# Altium footprint library LION.PcbLib: 90 footprints (part 10 of 13)
Each footprint in its own frame and in the unit in brackets; x right, y up, seen from the top. Pads: shape width x height; smd on the part's side, far side on the other; paste and mask are expansions set on the pad; w line width, h text height; cw(c..) or ccw(c..) is an arc to the next point about the centre after c.
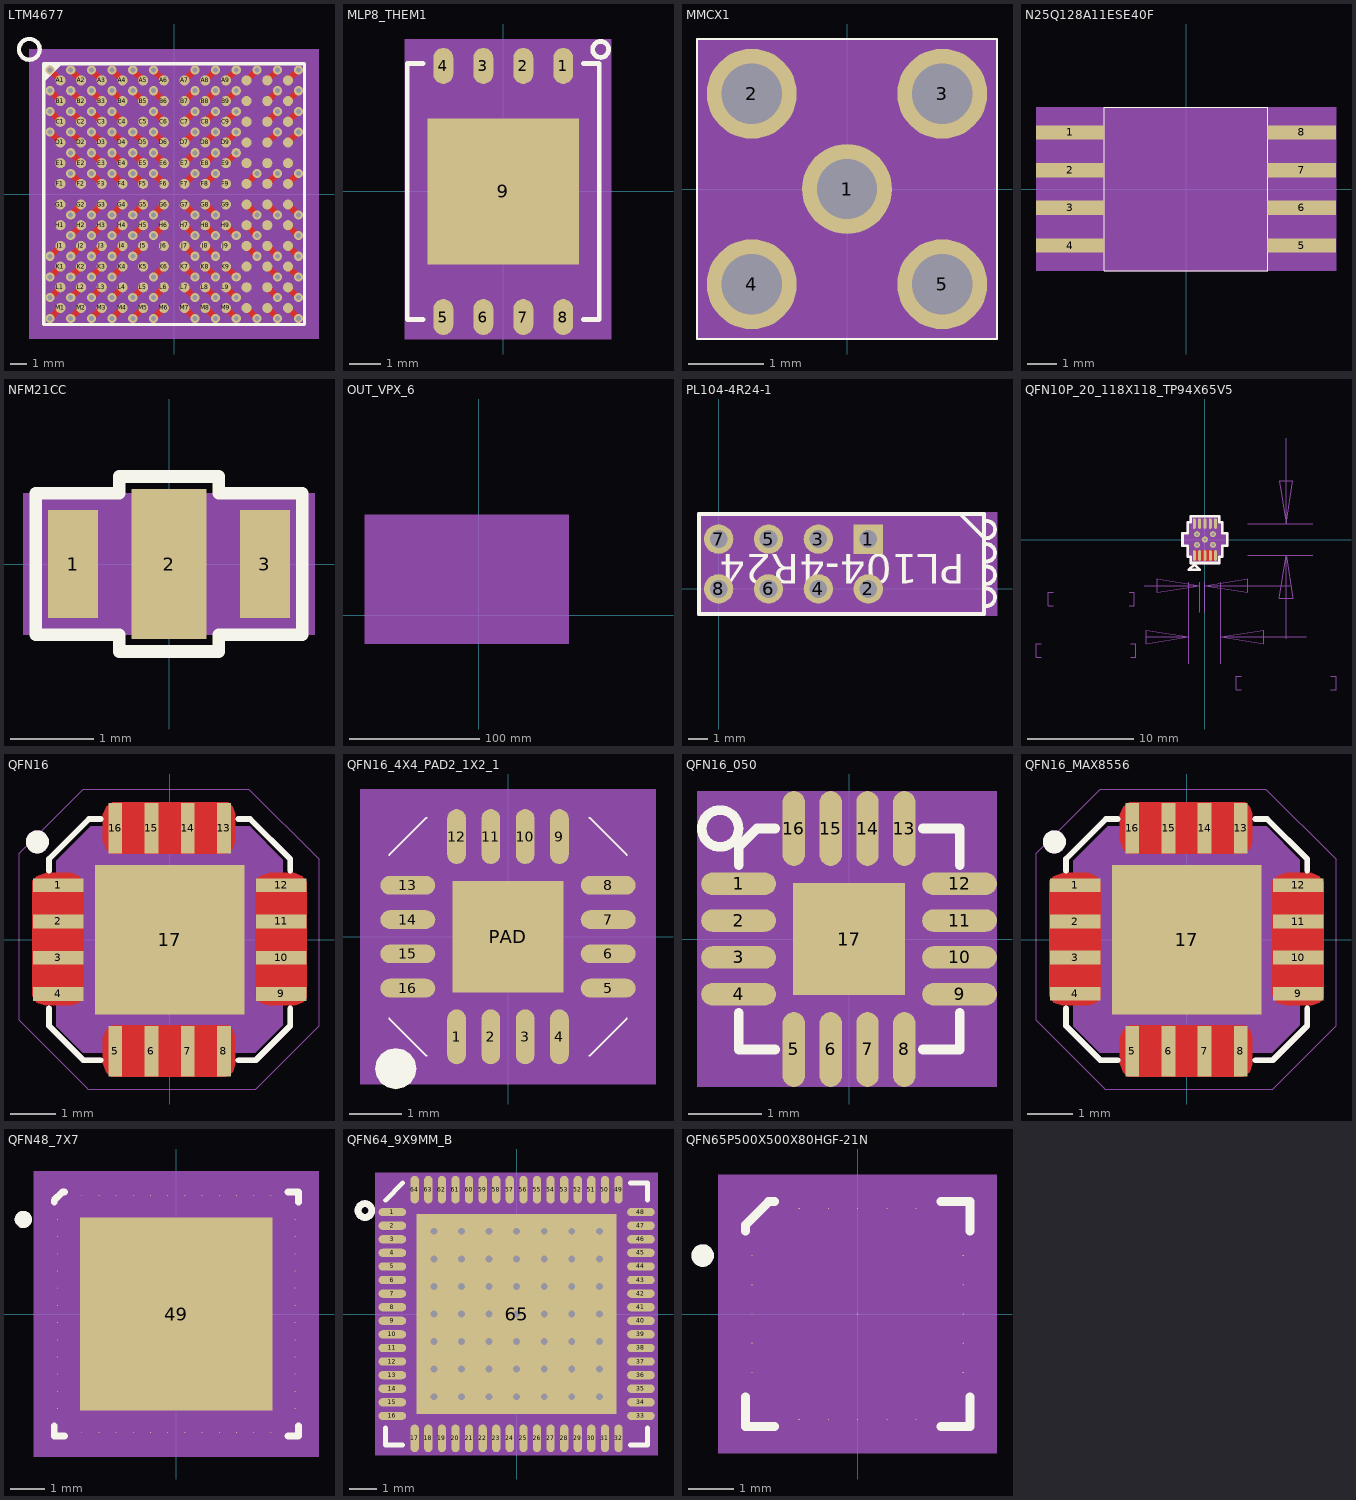
[diagram p9: the footprints below, top view; thin cyan lines are the x and y axes]

## LTM4677 [mm] "LTM4677"
pads (144):
  round 0.62 smd: A1(-6.985,6.985) A2(-5.715,6.985) A3(-4.445,6.985) A4(-3.175,6.985) A5(-1.905,6.985) A6(-0.635,6.985) A7(0.635,6.985) A8(1.905,6.985) A9(3.175,6.985) A10(4.445,6.985) A11(5.715,6.985) A12(6.985,6.985) B1(-6.985,5.715) B2(-5.715,5.715) B3(-4.445,5.715) B4(-3.175,5.715) B5(-1.905,5.715) B6(-0.635,5.715) B7(0.635,5.715) B8(1.905,5.715) B9(3.175,5.715) B10(4.445,5.715) B11(5.715,5.715) B12(6.985,5.715) C1(-6.985,4.445) C2(-5.715,4.445) C3(-4.445,4.445) C4(-3.175,4.445) C5(-1.905,4.445) C6(-0.635,4.445) C7(0.635,4.445) C8(1.905,4.445) C9(3.175,4.445) C10(4.445,4.445) C11(5.715,4.445) C12(6.985,4.445) D1(-6.985,3.175) D2(-5.715,3.175) D3(-4.445,3.175) D4(-3.175,3.175) D5(-1.905,3.175) D6(-0.635,3.175) D7(0.635,3.175) D8(1.905,3.175) D9(3.175,3.175) D10(4.445,3.175) D11(5.715,3.175) D12(6.985,3.175) E1(-6.985,1.905) E2(-5.715,1.905) E3(-4.445,1.905) E4(-3.175,1.905) E5(-1.905,1.905) E6(-0.635,1.905) E7(0.635,1.905) E8(1.905,1.905) E9(3.175,1.905) E10(4.445,1.905) E11(5.715,1.905) E12(6.985,1.905) F1(-6.985,0.635) F2(-5.715,0.635) F3(-4.445,0.635) F4(-3.175,0.635) F5(-1.905,0.635) F6(-0.635,0.635) F7(0.635,0.635) F8(1.905,0.635) F9(3.175,0.635) F10(4.445,0.635) F11(5.715,0.635) F12(6.985,0.635) G1(-6.985,-0.635) G2(-5.715,-0.635) G3(-4.445,-0.635) G4(-3.175,-0.635) G5(-1.905,-0.635) G6(-0.635,-0.635) G7(0.635,-0.635) G8(1.905,-0.635) G9(3.175,-0.635) G10(4.445,-0.635) G11(5.715,-0.635) G12(6.985,-0.635) H1(-6.985,-1.905) H2(-5.715,-1.905) H3(-4.445,-1.905) H4(-3.175,-1.905) H5(-1.905,-1.905) H6(-0.635,-1.905) H7(0.635,-1.905) H8(1.905,-1.905) H9(3.175,-1.905) H10(4.445,-1.905) H11(5.715,-1.905) H12(6.985,-1.905) J1(-6.985,-3.175) J2(-5.715,-3.175) J3(-4.445,-3.175) J4(-3.175,-3.175) J5(-1.905,-3.175) J6(-0.635,-3.175) J7(0.635,-3.175) J8(1.905,-3.175) J9(3.175,-3.175) J10(4.445,-3.175) J11(5.715,-3.175) J12(6.985,-3.175) K1(-6.985,-4.445) K2(-5.715,-4.445) K3(-4.445,-4.445) K4(-3.175,-4.445) K5(-1.905,-4.445) K6(-0.635,-4.445) K7(0.635,-4.445) K8(1.905,-4.445) K9(3.175,-4.445) K10(4.445,-4.445) K11(5.715,-4.445) K12(6.985,-4.445) L1(-6.985,-5.715) L2(-5.715,-5.715) L3(-4.445,-5.715) L4(-3.175,-5.715) L5(-1.905,-5.715) L6(-0.635,-5.715) L7(0.635,-5.715) L8(1.905,-5.715) L9(3.175,-5.715) L10(4.445,-5.715) L11(5.715,-5.715) L12(6.985,-5.715) M1(-6.985,-6.985) M2(-5.715,-6.985) M3(-4.445,-6.985) M4(-3.175,-6.985) M5(-1.905,-6.985) M6(-0.635,-6.985) M7(0.635,-6.985) M8(1.905,-6.985) M9(3.175,-6.985) M10(4.445,-6.985) M11(5.715,-6.985) M12(6.985,-6.985)
via -3.81,2.54 diameter 0.559 hole 0.305
via -1.27,1.27 diameter 0.559 hole 0.305
via -7.62,-3.81 diameter 0.559 hole 0.305
via -6.35,-3.81 diameter 0.559 hole 0.305
via -5.08,-3.81 diameter 0.559 hole 0.305
via -7.62,-5.08 diameter 0.559 hole 0.305
via -6.35,-5.08 diameter 0.559 hole 0.305
via -5.08,-5.08 diameter 0.559 hole 0.305
via -7.62,-6.35 diameter 0.559 hole 0.305
via -6.35,-6.35 diameter 0.559 hole 0.305
via -5.08,-6.35 diameter 0.559 hole 0.305
via -7.62,-7.62 diameter 0.559 hole 0.305
via -6.35,-7.62 diameter 0.559 hole 0.305
via -5.08,-7.62 diameter 0.559 hole 0.305
via -7.62,7.62 diameter 0.559 hole 0.305
via -6.35,7.62 diameter 0.559 hole 0.305
via -5.08,7.62 diameter 0.559 hole 0.305
via -5.08,3.81 diameter 0.559 hole 0.305
via -6.35,3.81 diameter 0.559 hole 0.305
via -7.62,3.81 diameter 0.559 hole 0.305
via -5.08,5.08 diameter 0.559 hole 0.305
via -6.35,5.08 diameter 0.559 hole 0.305
via -7.62,5.08 diameter 0.559 hole 0.305
via -5.08,6.35 diameter 0.559 hole 0.305
via -6.35,6.35 diameter 0.559 hole 0.305
via -7.62,6.35 diameter 0.559 hole 0.305
via 3.81,3.81 diameter 0.559 hole 0.305
via 3.81,-2.54 diameter 0.559 hole 0.305
via -3.81,1.27 diameter 0.559 hole 0.305
via -2.54,2.54 diameter 0.559 hole 0.305
via -2.54,1.27 diameter 0.559 hole 0.305
via -2.54,-7.62 diameter 0.559 hole 0.305
via -1.27,3.81 diameter 0.559 hole 0.305
via 2.54,3.81 diameter 0.559 hole 0.305
via -2.54,-3.81 diameter 0.559 hole 0.305
via 2.54,-3.81 diameter 0.559 hole 0.305
via -1.27,-1.27 diameter 0.559 hole 0.305
via -2.54,-1.27 diameter 0.559 hole 0.305
via -1.27,-5.08 diameter 0.559 hole 0.305
via -6.35,1.27 diameter 0.559 hole 0.305
via -2.54,3.81 diameter 0.559 hole 0.305
via -3.81,-2.54 diameter 0.559 hole 0.305
via 1.27,-3.81 diameter 0.559 hole 0.305
via -6.35,2.54 diameter 0.559 hole 0.305
via -6.35,-1.27 diameter 0.559 hole 0.305
via -1.27,-2.54 diameter 0.559 hole 0.305
via -2.54,-2.54 diameter 0.559 hole 0.305
via -6.35,-2.54 diameter 0.559 hole 0.305
via -3.81,-1.27 diameter 0.559 hole 0.305
via -2.54,7.62 diameter 0.559 hole 0.305
via -1.27,2.54 diameter 0.559 hole 0.305
via 2.54,2.54 diameter 0.559 hole 0.305
via 2.54,-2.54 diameter 0.559 hole 0.305
via 1.27,-2.54 diameter 0.559 hole 0.305
via 1.27,2.54 diameter 0.559 hole 0.305
via 7.62,-7.62 diameter 0.559 hole 0.305
via 6.35,-7.62 diameter 0.559 hole 0.305
via 7.62,-6.35 diameter 0.559 hole 0.305
via 6.35,-6.35 diameter 0.559 hole 0.305
via 7.62,-5.08 diameter 0.559 hole 0.305
via 6.35,-5.08 diameter 0.559 hole 0.305
via 7.62,-3.81 diameter 0.559 hole 0.305
via 6.35,-3.81 diameter 0.559 hole 0.305
via 7.62,-2.54 diameter 0.559 hole 0.305
via 6.35,1.27 diameter 0.559 hole 0.305
via 7.62,1.27 diameter 0.559 hole 0.305
via 6.35,6.35 diameter 0.559 hole 0.305
via 7.62,6.35 diameter 0.559 hole 0.305
via 6.35,5.08 diameter 0.559 hole 0.305
via 7.62,5.08 diameter 0.559 hole 0.305
via 6.35,3.81 diameter 0.559 hole 0.305
via 7.62,3.81 diameter 0.559 hole 0.305
via 7.62,7.62 diameter 0.559 hole 0.305
via 6.35,7.62 diameter 0.559 hole 0.305
via -1.27,-6.35 diameter 0.559 hole 0.305
via -1.27,-7.62 diameter 0.559 hole 0.305
via -3.81,-6.35 diameter 0.559 hole 0.305
via -2.54,-6.35 diameter 0.559 hole 0.305
via -3.81,-7.62 diameter 0.559 hole 0.305
via 1.27,-5.08 diameter 0.559 hole 0.305
via 2.54,-5.08 diameter 0.559 hole 0.305
via 3.81,-5.08 diameter 0.559 hole 0.305
via 1.27,-6.35 diameter 0.559 hole 0.305
via 2.54,-6.35 diameter 0.559 hole 0.305
via 3.81,-6.35 diameter 0.559 hole 0.305
via 1.27,-7.62 diameter 0.559 hole 0.305
via 2.54,-7.62 diameter 0.559 hole 0.305
via 3.81,-7.62 diameter 0.559 hole 0.305
via 5.08,-7.62 diameter 0.559 hole 0.305
via 5.08,-2.54 diameter 0.559 hole 0.305
via 5.08,-3.81 diameter 0.559 hole 0.305
via 7.62,-1.27 diameter 0.559 hole 0.305
via 5.08,1.27 diameter 0.559 hole 0.305
via 5.08,-1.27 diameter 0.559 hole 0.305
via 6.35,-1.27 diameter 0.559 hole 0.305
via -3.81,6.35 diameter 0.559 hole 0.305
via -2.54,6.35 diameter 0.559 hole 0.305
via -1.27,6.35 diameter 0.559 hole 0.305
via -1.27,5.08 diameter 0.559 hole 0.305
via 1.27,6.35 diameter 0.559 hole 0.305
via 1.27,5.08 diameter 0.559 hole 0.305
via 2.54,6.35 diameter 0.559 hole 0.305
via 3.81,6.35 diameter 0.559 hole 0.305
via 2.54,5.08 diameter 0.559 hole 0.305
via 3.81,5.08 diameter 0.559 hole 0.305
via -3.81,7.62 diameter 0.559 hole 0.305
via -1.27,7.62 diameter 0.559 hole 0.305
via 3.81,7.62 diameter 0.559 hole 0.305
via 2.54,7.62 diameter 0.559 hole 0.305
via 5.08,7.62 diameter 0.559 hole 0.305
via 1.27,7.62 diameter 0.559 hole 0.305
via -3.81,-3.81 diameter 0.559 hole 0.305
via -3.81,-5.08 diameter 0.559 hole 0.305
via 2.54,1.27 diameter 0.559 hole 0.305
via 2.54,-1.27 diameter 0.559 hole 0.305
via 1.27,3.81 diameter 0.559 hole 0.305
via -3.81,3.81 diameter 0.559 hole 0.305
via -3.81,5.08 diameter 0.559 hole 0.305
via 3.81,2.54 diameter 0.559 hole 0.305
via 1.27,1.27 diameter 0.559 hole 0.305
via 1.27,-1.27 diameter 0.559 hole 0.305
via -5.08,-2.54 diameter 0.559 hole 0.305
via -5.08,-1.27 diameter 0.559 hole 0.305
via -5.08,1.27 diameter 0.559 hole 0.305
via -5.08,2.54 diameter 0.559 hole 0.305
Top Layer:
  lines w0.381: -7.62,-7.62 -6.985,-6.985 ; -7.62,-6.35 -6.985,-5.715 ; -7.62,-5.08 -6.985,-4.445 ; -7.62,-3.81 -6.985,-3.175 ; -7.62,3.81 -6.985,3.175 ; -7.62,5.08 -6.985,4.445 ; -7.62,6.35 -6.985,5.715 ; -7.62,7.62 -6.985,6.985 ; -6.35,-7.62 -5.715,-6.985 ; -6.35,-6.35 -5.715,-5.715 ; -6.35,-5.08 -5.715,-4.445 ; -6.35,-3.81 -5.715,-3.175 ; -6.35,-2.54 -5.715,-1.905 ; -6.35,-1.27 -5.715,-0.635 ; -6.35,1.27 -5.715,0.635 ; -6.35,2.54 -5.715,1.905 ; -6.35,3.81 -5.715,3.175 ; -6.35,5.08 -5.715,4.445 ; -6.35,6.35 -5.715,5.715 ; -6.35,7.62 -5.715,6.985 ; -5.08,-7.62 -4.445,-6.985 ; -5.08,-6.35 -4.445,-5.715 ; -5.08,-5.08 -4.445,-4.445 ; -5.08,-3.81 -4.445,-3.175 ; -5.08,-2.54 -4.445,-1.905 ; -5.08,-1.27 -4.445,-0.635 ; -5.08,1.27 -4.445,0.635 ; -5.08,2.54 -4.445,1.905 ; -5.08,3.81 -4.445,3.175 ; -5.08,5.08 -4.445,4.445 ; -5.08,6.35 -4.445,5.715 ; -5.08,7.62 -4.445,6.985 ; -3.81,-7.62 -3.175,-6.985 ; -3.81,-6.35 -3.175,-5.715 ; -3.81,-5.08 -3.175,-4.445 ; -3.81,-3.81 -3.175,-3.175 ; -3.81,-2.54 -3.175,-1.905 ; -3.81,-1.27 -3.175,-0.635 ; -3.81,1.27 -3.175,0.635 ; -3.81,2.54 -3.175,1.905 ; -3.81,3.81 -3.175,3.175 ; -3.81,5.08 -3.175,4.445 ; -3.81,6.35 -3.175,5.715 ; -3.81,7.62 -3.175,6.985 ; -2.54,-7.62 -1.905,-6.985 ; -2.54,-6.35 -1.905,-5.715 ; -2.54,-3.81 -1.905,-3.175 ; -2.54,-2.54 -1.905,-1.905 ; -2.54,-1.27 -1.905,-0.635 ; -2.54,1.27 -1.905,0.635 ; -2.54,2.54 -1.905,1.905 ; -2.54,3.81 -1.905,3.175 ; -2.54,6.35 -1.905,5.715 ; -2.54,7.62 -1.905,6.985 ; -1.27,-7.62 -0.635,-6.985 ; -1.27,-6.35 -0.635,-5.715 ; -1.27,-5.08 -0.635,-4.445 ; -1.27,-2.54 -0.635,-1.905 ; -1.27,-1.27 -0.635,-0.635 ; -1.27,1.27 -0.635,0.635 ; -1.27,2.54 -0.635,1.905 ; -1.27,3.81 -0.635,3.175 ; -1.27,5.08 -0.635,4.445 ; -1.27,6.35 -0.635,5.715 ; -1.27,7.62 -0.635,6.985 ; 0.635,-6.985 1.27,-7.62 ; 0.635,-5.715 1.27,-6.35 ; 0.635,-4.445 1.27,-5.08 ; 0.635,-3.175 1.27,-3.81 ; 0.635,-1.905 1.27,-2.54 ; 0.635,-0.635 1.27,-1.27 ; 0.635,0.635 1.27,1.27 ; 0.635,1.905 1.27,2.54 ; 0.635,3.175 1.27,3.81 ; 0.635,4.445 1.27,5.08 ; 0.635,5.715 1.27,6.35 ; 0.635,6.985 1.27,7.62 ; 1.905,-6.985 2.54,-7.62 ; 1.905,-5.715 2.54,-6.35 ; 1.905,-4.445 2.54,-5.08 ; 1.905,-3.175 2.54,-3.81 ; 1.905,-1.905 2.54,-2.54 ; 1.905,-0.635 2.54,-1.27 ; 1.905,0.635 2.54,1.27 ; 1.905,1.905 2.54,2.54 ; 1.905,3.175 2.54,3.81 ; 1.905,4.445 2.54,5.08 ; 1.905,5.715 2.54,6.35 ; 1.905,6.985 2.54,7.62 ; 3.175,-6.985 3.81,-7.62 ; 3.175,-5.715 3.81,-6.35 ; 3.175,-4.445 3.81,-5.08 ; 3.175,-1.905 3.81,-2.54 ; 3.175,1.905 3.81,2.54 ; 3.175,3.175 3.81,3.81 ; 3.175,4.445 3.81,5.08 ; 3.175,5.715 3.81,6.35 ; 3.175,6.985 3.81,7.62 ; 4.445,-6.985 5.08,-7.62 ; 4.445,-3.175 5.08,-3.81 ; 4.445,-1.905 5.08,-2.54 ; 4.445,-0.635 5.08,-1.27 ; 4.445,0.635 5.08,1.27 ; 4.445,6.985 5.08,7.62 ; 5.715,-6.985 6.35,-7.62 ; 5.715,-5.715 6.35,-6.35 ; 5.715,-4.445 6.35,-5.08 ; 5.715,-3.175 6.35,-3.81 ; 5.715,-0.635 6.35,-1.27 ; 5.715,0.635 6.35,1.27 ; 5.715,3.175 6.35,3.81 ; 5.715,4.445 6.35,5.08 ; 5.715,5.715 6.35,6.35 ; 5.715,6.985 6.35,7.62 ; 6.985,-6.985 7.62,-7.62 ; 6.985,-5.715 7.62,-6.35 ; 6.985,-4.445 7.62,-5.08 ; 6.985,-3.175 7.62,-3.81 ; 6.985,-1.905 7.62,-2.54 ; 6.985,-0.635 7.62,-1.27 ; 6.985,0.635 7.62,1.27 ; 6.985,3.175 7.62,3.81 ; 6.985,4.445 7.62,5.08 ; 6.985,5.715 7.62,6.35 ; 6.985,6.985 7.62,7.62
Top Overlay:
  pour cut-out: -8,8 -6.857,8 -8,6.857
  lines w0.2: -8,-8 -8,8 8,8 8,-8 -8,-8
  lines w0.254: -9.525,8.89 cw(c-8.89,8.89) -8.89,9.525 cw(c-8.89,8.89) -8.255,8.89 cw(c-8.89,8.89) -8.89,8.255 cw(c-8.89,8.89) -9.525,8.89
  text ".Designator" at -8.466,-0.002 h0.64
Mechanical 5:
  lines w0.2: -8,-8 -8,8 8,8 8,-8 -8,-8
  lines w0.254: -9.525,8.89 ccw(c-8.89,8.89) -8.89,8.255 ccw(c-8.89,8.89) -8.255,8.89 ccw(c-8.89,8.89) -8.89,9.525 ccw(c-8.89,8.89) -9.525,8.89
  text "POWER_LTM4677_1_LTM4677_LTM4677" at 0,1.951 h0.64
  text "U100" at -8.466,-0.002 h0.64
Mechanical 14:
  text "E4" at -3.175,1.397 h0.64
  text "F6" at -0.635,0.127 h0.64
  text "J1" at -6.985,-3.683 h0.64
  text "J2" at -5.715,-3.683 h0.64
  text "J3" at -4.445,-3.683 h0.64
  text "K1" at -6.985,-4.953 h0.64
  text "K2" at -5.715,-4.953 h0.64
  text "K3" at -4.445,-4.953 h0.64
  text "L1" at -6.985,-6.223 h0.64
  text "L2" at -5.715,-6.223 h0.64
  text "L3" at -4.445,-6.223 h0.64
  text "M1" at -6.985,-7.493 h0.64
  text "M2" at -5.715,-7.493 h0.64
  text "M3" at -4.445,-7.493 h0.64
  text "A1" at -6.985,6.477 h0.64
  text "A2" at -5.715,6.477 h0.64
  text "A3" at -4.445,6.477 h0.64
  text "D3" at -4.445,2.667 h0.64
  text "D2" at -5.715,2.667 h0.64
  text "D1" at -6.985,2.667 h0.64
  text "C3" at -4.445,3.937 h0.64
  text "C2" at -5.715,3.937 h0.64
  text "C1" at -6.985,3.937 h0.64
  text "B3" at -4.445,5.207 h0.64
  text "B2" at -5.715,5.207 h0.64
  text "B1" at -6.985,5.207 h0.64
  text "D9" at 3.175,2.667 h0.64
  text "H9" at 3.175,-2.413 h0.64
  text "F4" at -3.175,0.127 h0.64
  text "C10" at 4.445,3.683 h0.64
  text "E11" at 5.715,1.143 h0.64
  text "H11" at 5.715,-2.667 h0.64
  text "K10" at 4.445,-5.207 h0.64
  text "F9" at 3.175,0.127 h0.64
  text "G9" at 3.175,-1.143 h0.64
  text "B10" at 4.445,4.953 h0.64
  text "L10" at 4.445,-6.477 h0.64
  text "J6" at -0.635,-3.683 h0.64
  text "D10" at 4.445,2.413 h0.64
  text "E10" at 4.445,1.143 h0.64
  text "J9" at 3.175,-3.683 h0.64
  text "E5" at -1.905,1.397 h0.64
  text "F5" at -1.905,0.127 h0.64
  text "M5" at -1.905,-7.493 h0.64
  text "D6" at -0.635,2.667 h0.64
  text "D8" at 1.905,2.667 h0.64
  text "K5" at -1.905,-4.953 h0.64
  text "J5" at -1.905,-3.683 h0.64
  text "J8" at 1.905,-3.683 h0.64
  text "G6" at -0.635,-1.143 h0.64
  text "G5" at -1.905,-1.143 h0.64
  text "K6" at -0.635,-4.953 h0.64
  text "F2" at -5.715,0.127 h0.64
  text "F1" at -6.985,0.127 h0.64
  text "C5" at -1.905,3.937 h0.64
  text "D5" at -1.905,2.667 h0.64
  text "H4" at -3.175,-2.413 h0.64
  text "J7" at 0.635,-3.683 h0.64
  text "E2" at -5.715,1.397 h0.64
  text "E1" at -6.985,1.397 h0.64
  text "G2" at -5.715,-1.143 h0.64
  text "G1" at -6.985,-1.143 h0.64
  text "H6" at -0.635,-2.413 h0.64
  text "H5" at -1.905,-2.413 h0.64
  text "H2" at -5.715,-2.413 h0.64
  text "H1" at -6.985,-2.413 h0.64
  text "G4" at -3.175,-1.143 h0.64
  text "A5" at -1.905,6.477 h0.64
  text "E6" at -0.635,1.397 h0.64
  text "E8" at 1.905,1.397 h0.64
  text "H8" at 1.905,-2.413 h0.64
  text "H7" at 0.635,-2.413 h0.64
  text "E7" at 0.635,1.397 h0.64
  text "M12" at 6.985,-7.747 h0.64
  text "M11" at 5.715,-7.747 h0.64
  text "L12" at 6.985,-6.477 h0.64
  text "L11" at 5.715,-6.477 h0.64
  text "K12" at 6.985,-5.207 h0.64
  text "K11" at 5.715,-5.207 h0.64
  text "J12" at 6.985,-3.937 h0.64
  text "J11" at 5.715,-3.937 h0.64
  text "H12" at 6.985,-2.667 h0.64
  text "E12" at 6.985,1.143 h0.64
  text "F11" at 5.715,-0.127 h0.64
  text "F12" at 6.985,-0.127 h0.64
  text "B11" at 5.715,4.953 h0.64
  text "B12" at 6.985,4.953 h0.64
  text "C11" at 5.715,3.683 h0.64
  text "C12" at 6.985,3.683 h0.64
  text "D11" at 5.715,2.413 h0.64
  text "D12" at 6.985,2.413 h0.64
  text "A12" at 6.985,6.223 h0.64
  text "A11" at 5.715,6.223 h0.64
  text "L6" at -0.635,-6.223 h0.64
  text "M6" at -0.635,-7.493 h0.64
  text "L4" at -3.175,-6.223 h0.64
  text "L5" at -1.905,-6.223 h0.64
  text "M4" at -3.175,-7.493 h0.64
  text "K7" at 0.635,-4.953 h0.64
  text "K8" at 1.905,-4.953 h0.64
  text "K9" at 3.175,-4.953 h0.64
  text "L7" at 0.635,-6.223 h0.64
  text "L8" at 1.905,-6.223 h0.64
  text "L9" at 3.175,-6.223 h0.64
  text "M7" at 0.635,-7.493 h0.64
  text "M8" at 1.905,-7.493 h0.64
  text "M9" at 3.175,-7.493 h0.64
  text "M10" at 4.445,-7.747 h0.64
  text "H10" at 4.445,-2.667 h0.64
  text "J10" at 4.445,-3.937 h0.64
  text "G12" at 6.985,-1.397 h0.64
  text "F10" at 4.445,-0.127 h0.64
  text "G10" at 4.445,-1.397 h0.64
  text "G11" at 5.715,-1.397 h0.64
  text "B4" at -3.175,5.207 h0.64
  text "B5" at -1.905,5.207 h0.64
  text "B6" at -0.635,5.207 h0.64
  text "C6" at -0.635,3.937 h0.64
  text "B7" at 0.635,5.207 h0.64
  text "C7" at 0.635,3.937 h0.64
  text "B8" at 1.905,5.207 h0.64
  text "B9" at 3.175,5.207 h0.64
  text "C8" at 1.905,3.937 h0.64
  text "C9" at 3.175,3.937 h0.64
  text "A4" at -3.175,6.477 h0.64
  text "A6" at -0.635,6.477 h0.64
  text "A9" at 3.175,6.477 h0.64
  text "A8" at 1.905,6.477 h0.64
  text "A10" at 4.445,6.223 h0.64
  text "A7" at 0.635,6.477 h0.64
  text "J4" at -3.175,-3.683 h0.64
  text "K4" at -3.175,-4.953 h0.64
  text "F8" at 1.905,0.127 h0.64
  text "G8" at 1.905,-1.143 h0.64
  text "D7" at 0.635,2.667 h0.64
  text "D4" at -3.175,2.667 h0.64
  text "C4" at -3.175,3.937 h0.64
  text "E9" at 3.175,1.397 h0.64
  text "F7" at 0.635,0.127 h0.64
  text "G7" at 0.635,-1.143 h0.64
  text "H3" at -4.445,-2.413 h0.64
  text "G3" at -4.445,-1.143 h0.64
  text "F3" at -4.445,0.127 h0.64
  text "E3" at -4.445,1.397 h0.64
Mechanical 16:
  pour cut-out: -8,8 -6.857,8 -8,6.857
  pour cut-out: -8.25,-8.25 -8.25,8.25 8.25,8.25 8.25,-8.25
  region: -8.89,-8.89 -8.89,8.89 8.89,8.89 8.89,-8.89
  lines w0.1: -8,-8 -8,8 8,8 8,-8 -8,-8
Mechanical 17:
  text "LTM4677IY" at 0,5.334 h0.64
3D body: height 3.81, standoff 0, extent -8.89,-8.89 8.89,8.89

## MLP8_THEM1 [mil] "MLP8_THEM1"
pads (9):
  oval 25x45 smd: 1(75,157) 2(25,157) 3(-25,157) 4(-75,157) 5(-75,-157) 6(-25,-157) 7(25,-157) 8(75,-157)
  rect 188.98x183.07 smd: 9(0,0)
Top Overlay:
  lines w6: -100,-160 -120,-160 -120,160 -100,160 ; 100,-160 120,-160 120,160 100,160 ; 111.81,177.66 cw(c121.81,177.66) 121.81,187.66 cw(c121.81,177.66) 131.81,177.66 cw(c121.81,177.66) 121.81,167.66 cw(c121.81,177.66) 111.81,177.66
Mechanical 5:
  lines w6: -100,-160 -120,-160 -120,160 -100,160 ; 100,-160 120,-160 120,160 100,160 ; 111.81,177.66 ccw(c121.81,177.66) 121.81,167.66 ccw(c121.81,177.66) 131.81,177.66 ccw(c121.81,177.66) 121.81,187.66 ccw(c121.81,177.66) 111.81,177.66
  text "U17" at -140.75,87.16 h25
Mechanical 14:
  text "8" at 75,-161 h10
  text "3" at -25,153 h10
  text "1" at 75,153 h10
  text "5" at -75,-161 h10
  text "7" at 25,-161 h10
  text "2" at 25,153 h10
  text "6" at -25,-161 h10
  text "4" at -75,153 h10
  text "9" at 0,-20 h25
Mechanical 16:
  region: -123,-184.5 134.81,-184.5 134.81,190.66 -123,190.66
  lines w6: -100,-160 -120,-160 -120,160 -100,160 ; 100,-160 120,-160 120,160 100,160
Mechanical 17:
  text "MT25QU256ABA1EW9-0SIT" at -100,-60 h25
  text ".Designator" at -10,-10 h31.1
3D body: height 150, standoff 0, extent -123,-184.5 134.81,190.66

## MMCX1 [mil] "MMCX1"
pads (5):
  round 47.24 hole 31.5: 1(0,0) 2(-50,50) 3(50,50) 4(-50,-50) 5(50,-50)
Top Overlay:
  lines w1: -78.74,-78.74 78.74,-78.74 78.74,78.74 -78.74,78.74 -78.74,-78.74
  text ".Designator" at -20,105 h25
Mechanical 5:
  lines w1: -78.74,-78.74 78.74,-78.74 78.74,78.74 -78.74,78.74 -78.74,-78.74
  text "X5" at -55,140 h25
Mechanical 14:
  text "2" at -50,58 h20
  text "4" at -50,-42 h20
  text "3" at 50,58 h20
  text "5" at 50,-42 h20
  text "1" at 0,8 h20
Mechanical 16:
  pour cut-out: -78.74,78.74 -78.74,-78.74 78.74,-78.74 78.74,78.74
  region: -78.74,78.74 -78.74,-78.74 78.74,-78.74 78.74,78.74
  lines w1: -78.74,-78.74 78.74,-78.74 78.74,78.74 -78.74,78.74 -78.74,-78.74
3D body: height 150, standoff 0, extent -78.74,-78.74 78.74,78.74

## N25Q128A11ESE40F [mil] "N25Q128A11ESE40F"
pads (8):
  rect 90.55x18.9 smd: 1(-153.54,75) 2(-153.54,25) 3(-153.54,-25) 4(-153.54,-75) 5(153.54,-75) 6(153.54,-25) 7(153.54,25) 8(153.54,75)
Top Overlay:
  lines w1: -108.27,-108.27 108.27,-108.27 108.27,108.27 -108.27,108.27 -108.27,-108.27
Mechanical 14:
  text "8" at 145.54,75 h20
  text "5" at 145.54,-75 h20
  text "2" at -161.54,25 h20
  text "6" at 145.54,-25 h20
  text "7" at 145.54,25 h20
  text "3" at -161.54,-25 h20
  text "1" at -161.54,75 h20
  text "4" at -161.54,-75 h20
Mechanical 16:
  pour cut-out: -199.02,-108.27 -199.02,108.27 199.02,108.27 199.02,-108.27
  region: -199.02,-108.27 -199.02,108.27 199.02,108.27 199.02,-108.27
  lines w1: -108.27,-108.27 108.27,-108.27 108.27,108.27 -108.27,108.27 -108.27,-108.27
Mechanical 20:
  text ".Designator" at -5.67,0 h5
3D body: height 150, standoff 0, extent -199.02,-108.27 199.02,108.27

## NFM21CC [mil] "NFM21CC"
pads (3):
  rect 23.62x51.18 smd: 1(-45.28,0) 3(45.28,0)
  rect 35.43x70.87 smd: 2(0,0)
Top Overlay:
  lines w5.91: -62.99,-33.46 -62.99,33.46 -23.62,33.46 -23.62,41.34 23.62,41.34 23.62,33.46 62.99,33.46 62.99,-33.46 23.62,-33.46 23.62,-41.34 -23.62,-41.34 -23.62,-33.46 -62.99,-33.46
Mechanical 14:
  text "3" at 45.28,-8 h10
  text "1" at -45.28,-8 h10
  text "2" at 0,-8 h10
Mechanical 16:
  region: -68.9,33.46 -68.9,-33.46 68.9,-33.46 68.9,33.46
Mechanical 20:
  text "NFM21PC225B0J3" at -19.69,60.24 h10
3D body: height 150, standoff 0, extent -68.9,-33.46 68.9,33.46

## OUT_VPX_6 [mil] "OUT_VPX_6"
pads (6):
  oct 1x1 smd: 1(5156.94,3968.86) 2(5436.94,1368.86) 3(5436.94,-731.14) 4(-3670.36,-731.14) 5(-3670.36,1368.86) 6(-3670.36,3968.86)
Top Overlay:
  text ".Designator" at 5107.89,3871.41 h25
Mechanical 5:
  text "U81" at 5107.89,3871.41 h25
Mechanical 14:
  text "5" at -3670.36,1384.86 h20
  text "6" at -3670.36,3984.86 h20
  text "4" at -3670.36,-715.14 h20
  text "1" at 5156.94,3984.86 h20
  text "2" at 5436.94,1384.86 h20
  text "3" at 5436.94,-715.14 h20
Mechanical 16:
  region: -3468.86,-870.36 2731.14,-870.36 2731.14,3046.94 -3468.86,3046.94
3D body: height 150, standoff 0, extent -3468.86,-870.36 2731.14,3046.94
